# Altium footprint library PcbLib_ICs.PcbLib: 317 footprints (part 11 of 24) (continued)
## MSOP-8 [mm] "TSOP, 8-Leads, Body 3.00x3.00mm, Pitch 0.65mm, IPC Medium Density" (continued)
  text ".Designator" at -2.579,-0.349 h1.5
Top Text:
  lines w0.05: -3.2,-1.8 3.2,-1.8 3.2,1.8 -3.2,1.8 -3.2,-1.8
  lines w0.1: -0.5,0 0.5,0 ; 0,-0.5 0,0.5
3D body "SW3dPS-MSOP8.STEP": height 1.1, standoff 0, extent -2.519,-1.55 2.419,1.55

## MSOP-8EP [mm] "TSOP, 8-Leads, Body 3.00x3.00mm, Pitch 0.65mm, IPC Medium Density"
height 1.1
pads (9):
  rect 1.75x0.45 smd paste+0 mask+0.05: 1(-2.075,0.975)
  oval 1.75x0.45 smd paste+0 mask+0.05: 2(-2.075,0.325) 3(-2.075,-0.325) 4(-2.075,-0.975) 5(2.075,-0.975) 6(2.075,-0.325) 7(2.075,0.325) 8(2.075,0.975)
  rect 1.8x2.5 smd paste-10: EP(0,0)
via -0.4,0.8 diameter 0.7 hole 0.3
via 0.4,0.8 diameter 0.7 hole 0.3
via 0.4,0 diameter 0.7 hole 0.3
via -0.4,0 diameter 0.7 hole 0.3
via 0.4,-0.8 diameter 0.7 hole 0.3
via -0.4,-0.8 diameter 0.7 hole 0.3
Top Overlay:
  circle w0.25: c-2.75,1.75 r0.125
  lines w0.2: -1.75,-1.4 -1.75,-1.725 1.75,-1.725 1.75,-1.4 ; -1.75,1.4 -1.75,1.725 1.75,1.725 1.75,1.4
Top Paste:
  rectangle: -0.8,-1.15 -0.1,-0.45
  rectangle: 0.1,-1.15 0.8,-0.45
  rectangle: -0.8,-0.35 -0.1,0.35
  rectangle: 0.1,-0.35 0.8,0.35
  rectangle: 0.1,0.45 0.8,1.15
  rectangle: -0.8,0.45 -0.1,1.15
Bottom Solder:
  region: -1,1.5 1,1.5 1,0.3 0.7,0 1,-0.3 1,-1.5 -1,-1.5 -1,-0.3 -0.7,0 -1,0.3
Top Assy:
  circle w0.05: c-1,1 r0.2
  lines w0.05: -2.1,-1.125 -2.5,-1.125 -2.5,-0.825 -2.1,-0.825 ; -2.1,-1.125 -2.1,-0.825 ; -2.1,-1.125 -2,-1.125 ; -2.1,-0.825 -2,-0.825 ; -2.1,-0.475 -2.5,-0.475 -2.5,-0.175 -2.1,-0.175 ; -2.1,-0.475 -2.1,-0.175 ; -2.1,-0.475 -2,-0.475 ; -2.1,-0.175 -2,-0.175 ; -2.1,0.175 -2.5,0.175 -2.5,0.475 -2.1,0.475 ; -2.1,0.175 -2.1,0.475 ; -2.1,0.175 -2,0.175 ; -2.1,0.475 -2,0.475 ; -2.1,0.825 -2.5,0.825 -2.5,1.125 -2.1,1.125 ; -2.1,0.825 -2.1,1.125 ; -2.1,0.825 -2,0.825 ; -2.1,1.125 -2,1.125 ; -2,-1.125 -2,-0.825 ; -2,-1.125 -1.8,-1.125 ; -2,-0.825 -1.8,-0.825 ; -2,-0.475 -2,-0.175 ; -2,-0.475 -1.8,-0.475 ; -2,-0.175 -1.8,-0.175 ; -2,0.175 -2,0.475 ; -2,0.175 -1.8,0.175 ; -2,0.475 -1.8,0.475 ; -2,0.825 -2,1.125 ; -2,0.825 -1.8,0.825 ; -2,1.125 -1.8,1.125 ; -1.8,-1.125 -1.5,-1.125 ; -1.8,-1.125 -1.8,-0.825 ; -1.8,-0.825 -1.5,-0.825 ; -1.8,-0.475 -1.5,-0.475 ; -1.8,-0.475 -1.8,-0.175 ; -1.8,-0.175 -1.5,-0.175 ; -1.8,0.175 -1.5,0.175 ; -1.8,0.175 -1.8,0.475 ; -1.8,0.475 -1.5,0.475 ; -1.8,0.825 -1.5,0.825 ; -1.8,0.825 -1.8,1.125 ; -1.8,1.125 -1.5,1.125 ; -1.5,-1.5 -1.5,-1.125 ; -1.5,-1.5 -1.438,-1.438 ; -1.5,-1.5 1.5,-1.5 ; -1.5,-1.125 -1.5,-0.825 ; -1.5,-0.825 -1.5,-0.475 ; -1.5,-0.475 -1.5,-0.175 ; -1.5,-0.175 -1.5,0.175 ; -1.5,0.175 -1.5,0.475 ; -1.5,0.475 -1.5,0.825 ; -1.5,0.825 -1.5,1.125 ; -1.5,1.125 -1.5,1.5 ; -1.5,1.5 -1.438,1.438 ; -1.5,1.5 1.5,1.5 ; -1.438,-1.438 -1.438,1.438 ; -1.438,-1.438 1.438,-1.438 ; -1.438,1.438 1.438,1.438 ; 1.438,-1.438 1.5,-1.5 ; 1.438,-1.438 1.438,1.438 ; 1.438,1.438 1.5,1.5 ; 1.5,-1.5 1.5,-1.125 ; 1.5,-1.125 1.5,-0.825 ; 1.5,-1.125 1.8,-1.125 ; 1.5,-0.825 1.5,-0.475 ; 1.5,-0.825 1.8,-0.825 ; 1.5,-0.475 1.5,-0.175 ; 1.5,-0.475 1.8,-0.475 ; 1.5,-0.175 1.8,-0.175 ; 1.5,-0.175 1.5,0.175 ; 1.5,0.175 1.5,0.475 ; 1.5,0.175 1.8,0.175 ; 1.5,0.475 1.5,0.825 ; 1.5,0.475 1.8,0.475 ; 1.5,0.825 1.5,1.125 ; 1.5,0.825 1.8,0.825 ; 1.5,1.125 1.5,1.5 ; 1.5,1.125 1.8,1.125 ; 1.8,-1.125 2,-1.125 ; 1.8,-1.125 1.8,-0.825 ; 1.8,-0.825 2,-0.825 ; 1.8,-0.475 2,-0.475 ; 1.8,-0.475 1.8,-0.175 ; 1.8,-0.175 2,-0.175 ; 1.8,0.175 2,0.175 ; 1.8,0.175 1.8,0.475 ; 1.8,0.475 2,0.475 ; 1.8,0.825 2,0.825 ; 1.8,0.825 1.8,1.125 ; 1.8,1.125 2,1.125 ; 2,-1.125 2,-0.825 ; 2,-1.125 2.1,-1.125 ; 2,-0.825 2.1,-0.825 ; 2,-0.475 2,-0.175 ; 2,-0.475 2.1,-0.475 ; 2,-0.175 2.1,-0.175 ; 2,0.175 2,0.475 ; 2,0.175 2.1,0.175 ; 2,0.475 2.1,0.475 ; 2,0.825 2,1.125 ; 2,0.825 2.1,0.825 ; 2,1.125 2.1,1.125 ; 2.1,-1.125 2.5,-1.125 2.5,-0.825 2.1,-0.825 ; 2.1,-1.125 2.1,-0.825 ; 2.1,-0.475 2.5,-0.475 2.5,-0.175 2.1,-0.175 ; 2.1,-0.475 2.1,-0.175 ; 2.1,0.175 2.5,0.175 2.5,0.475 2.1,0.475 ; 2.1,0.175 2.1,0.475 ; 2.1,0.825 2.5,0.825 2.5,1.125 2.1,1.125 ; 2.1,0.825 2.1,1.125
  text ".Designator" at -2.579,-0.349 h1.5
Top Text:
  lines w0.05: -3.2,-1.8 3.2,-1.8 3.2,1.8 -3.2,1.8 -3.2,-1.8
  lines w0.1: -0.5,0 0.5,0 ; 0,-0.5 0,0.5
3D body "SW3dPS-MSOP8.STEP": height 1.1, standoff 0, extent -2.519,-1.55 2.419,1.55

## MSOP-10 [mm] "TSOP, 8-Leads, Body 3.00x3.00mm, Pitch 0.65mm, IPC Medium Density"
height 1.1
pads (10):
  rect 1.45x0.3 smd paste+0 mask+0.05: 1(-2.2,1)
  oval 1.45x0.3 smd paste+0 mask+0.05: 2(-2.2,0.5) 3(-2.2,0) 4(-2.2,-0.5) 5(-2.2,-1) 6(2.2,-1) 7(2.2,-0.5) 8(2.2,0) 9(2.2,0.5) 10(2.2,1)
Top Overlay:
  circle w0.25: c-2.75,1.75 r0.125
  lines w0.2: -1.75,-1.4 -1.75,-1.725 1.75,-1.725 1.75,-1.4 ; -1.75,1.4 -1.75,1.725 1.75,1.725 1.75,1.4
Top Assy:
  drawing of 195 lines, arcs and shapes, not listed
  text ".Designator" at -2.579,-0.349 h1.5
Top Text:
  lines w0.05: -3.2,-1.8 3.2,-1.8 3.2,1.8 -3.2,1.8 -3.2,-1.8
  lines w0.1: -0.5,0 0.5,0 ; 0,-0.5 0,0.5
3D body "User Library-msop-10.step": height 1.15, standoff 0, extent -2.45,-1.5 2.45,1.5

## MSOP-12EP [mm] "MSOP, 12-Leads, Body 3.00x4.00mm, Pitch 0.65mm"
height 1.1
pads (13):
  rect 1.1x0.42 smd paste+0 mask+0.05: 1(-2.15,1.625)
  oval 1.1x0.42 smd paste+0 mask+0.05: 2(-2.15,0.975) 3(-2.15,0.325) 4(-2.15,-0.325) 5(-2.15,-0.975) 6(-2.15,-1.625) 7(2.15,-1.625) 8(2.15,-0.975) 9(2.15,-0.325) 10(2.15,0.325) 11(2.15,0.975) 12(2.15,1.625)
  rrect10% 1.65x2.9 smd paste+0 mask+0.05: EP(0,0)
via -0.4,0.8 diameter 0.7 hole 0.3
via 0.4,0.8 diameter 0.7 hole 0.3
via 0.4,0 diameter 0.7 hole 0.3
via -0.4,0 diameter 0.7 hole 0.3
via 0.4,-0.8 diameter 0.7 hole 0.3
via -0.4,-0.8 diameter 0.7 hole 0.3
Top Overlay:
  circle w0.25: c-2.65,2.375 r0.125
  lines w0.2: -1.75,-2.1 -1.75,-2.35 1.75,-2.35 1.75,-2.1 ; -1.75,2.1 -1.75,2.35 1.75,2.35 1.75,2.1
Bottom Solder:
  region: -1.2,1.5 -0.3,1.5 0,1.2 0.3,1.5 1.2,1.5 1.2,0.3 0.9,0 1.2,-0.3 1.2,-1.5 0.3,-1.5 0,-1.2 -0.3,-1.5 -1.2,-1.5 -1.2,-0.3 -0.9,0 -1.2,0.3
Top Assy:
  drawing of 249 lines, arcs and shapes, not listed
  text ".Designator" at 0.35,-2.579 h1.5
Top Text:
  lines w0.05: -2.8,-2.5 -2.8,2.5 2.8,2.5 2.8,-2.5 -2.8,-2.5
  lines w0.1: -0.5,0 0.5,0 ; 0,-0.5 0,0.5
3D body "MSOP12-EP.step": height 0.98, standoff 0, extent -2.45,-2.02 2.45,2.019

## MSOP-16 [mm] "MSOP, 16-Leads, Body 4,04x3,00mm, Pitch 0,50mm, IPC Medium Density"
height 1.1
pads (16):
  rect 1.35x0.3 smd mask+0.05: 1(-2.225,1.75)
  oval 1.35x0.3 smd mask+0.05: 2(-2.225,1.25) 3(-2.225,0.75) 4(-2.225,0.25) 5(-2.225,-0.25) 6(-2.225,-0.75) 7(-2.225,-1.25) 8(-2.225,-1.75) 9(2.225,-1.75) 10(2.225,-1.25) 11(2.225,-0.75) 12(2.225,-0.25) 13(2.225,0.25) 14(2.225,0.75) 15(2.225,1.25) 16(2.225,1.75)
Top Overlay:
  circle w0.25: c-2.5,2.5 r0.125
  lines w0.2: -1.775,-2.15 -1.775,-2.475 1.725,-2.475 1.725,-2.15 ; -1.725,2.15 -1.725,2.475 1.775,2.475 1.775,2.15
Top Assy:
  drawing of 270 lines, arcs and shapes, not listed
  text ".Designator" at 0.349,-2.579 h1.5
Top Text:
  lines w0.05: -3.15,-2.35 3.15,-2.35 3.15,2.35 -3.15,2.35 -3.15,-2.35
  lines w0.1: -0.5,0 0.5,0 ; 0,-0.5 0,0.5
3D body "MSOP-16.step": height 1.1, standoff 0, extent -2.45,-2.05 2.45,2.05

## MSOP-16EP [mm] "MSOP, 16-Leads, Body 4,04x3,00mm, Pitch 0,50mm, IPC Medium Density"
height 1.1
pads (17):
  rect 1.35x0.3 smd mask+0.05: 1(-2.225,1.75)
  oval 1.35x0.3 smd mask+0.05: 2(-2.225,1.25) 3(-2.225,0.75) 4(-2.225,0.25) 5(-2.225,-0.25) 6(-2.225,-0.75) 7(-2.225,-1.25) 8(-2.225,-1.75) 9(2.225,-1.75) 10(2.225,-1.25) 11(2.225,-0.75) 12(2.225,-0.25) 13(2.225,0.25) 14(2.225,0.75) 15(2.225,1.25) 16(2.225,1.75)
  rrect8% 1.65x2.85 smd paste-10 mask+0.05: EP(0,0)
via -0.4,-0.8 diameter 0.7 hole 0.3
via 0.4,-0.8 diameter 0.7 hole 0.3
via -0.4,0 diameter 0.7 hole 0.3
via 0.4,0 diameter 0.7 hole 0.3
via 0.4,0.8 diameter 0.7 hole 0.3
via -0.4,0.8 diameter 0.7 hole 0.3
Top Overlay:
  circle w0.25: c-2.5,2.5 r0.125
  lines w0.2: -1.725,-2.15 -1.725,-2.25 1.775,-2.25 1.775,-2.15 ; -1.725,2.15 -1.725,2.25 1.775,2.25 1.775,2.15
Top Paste:
  rectangle: -0.8,0.55 -0.1,1.25
  rectangle: 0.1,0.55 0.8,1.25
  rectangle: 0.1,-0.35 0.8,0.35
  rectangle: -0.8,-0.35 -0.1,0.35
  rectangle: 0.1,-1.25 0.8,-0.55
  rectangle: -0.8,-1.25 -0.1,-0.55
Bottom Solder:
  region: -1.2,1.5 -0.3,1.5 0,1.2 0.3,1.5 1.2,1.5 1.2,0.3 0.9,0 1.2,-0.3 1.2,-1.5 0.3,-1.5 0,-1.2 -0.3,-1.5 -1.2,-1.5 -1.2,-0.3 -0.9,0 -1.2,0.3
Top Assy:
  drawing of 270 lines, arcs and shapes, not listed
  text ".Designator" at 0.349,-2.579 h1.5
Top Text:
  lines w0.05: -3.15,-2.35 3.15,-2.35 3.15,2.35 -3.15,2.35 -3.15,-2.35
  lines w0.1: -0.5,0 0.5,0 -0.5,0 ; 0,-0.5 0,0.5 0,-0.5
3D body "MSOP-16EP.STEP": height 0.86, standoff 0, extent -2.45,-2.019 2.45,2.02

## PBGA-491 [mm] "BGA, 491-Leads, Body 17.00x17.00mmx0.90mm, Pitch 0.65mm"
height 0.9
pads (491):
  round 0.36 smd paste+0 mask+0.05: A1(-7.8,-7.8) A2(-7.8,-7.15) A3(-7.8,-6.5) A4(-7.8,-5.85) A5(-7.8,-5.2) A6(-7.8,-4.55) A7(-7.8,-3.9) A8(-7.8,-3.25) A9(-7.8,-2.6) A10(-7.8,-1.95) A11(-7.8,-1.3) A12(-7.8,-0.65) A13(-7.8,0) A14(-7.8,0.65) A15(-7.8,1.3) A16(-7.8,1.95) A17(-7.8,2.6) A18(-7.8,3.25) A19(-7.8,3.9) A20(-7.8,4.55) A21(-7.8,5.2) A22(-7.8,5.85) A23(-7.8,6.5) A24(-7.8,7.15) A25(-7.8,7.8) AA1(5.2,-7.8) AA2(5.2,-7.15) AA3(5.2,-6.5) AA7(5.2,-3.9) AA9(5.2,-2.6) AA10(5.2,-1.95) AA12(5.2,-0.65) AA13(5.2,0) AA15(5.2,1.3) AA16(5.2,1.95) AA18(5.2,3.25) AA19(5.2,3.9) AA23(5.2,6.5) AA24(5.2,7.15) AA25(5.2,7.8) AB1(5.85,-7.8) AB2(5.85,-7.15) AB6(5.85,-4.55) AB7(5.85,-3.9) AB9(5.85,-2.6) AB10(5.85,-1.95) AB12(5.85,-0.65) AB13(5.85,0) AB15(5.85,1.3) AB16(5.85,1.95) AB18(5.85,3.25) AB19(5.85,3.9) AB20(5.85,4.55) AB24(5.85,7.15) AB25(5.85,7.8) AC1(6.5,-7.8) AC2(6.5,-7.15) AC3(6.5,-6.5) AC5(6.5,-5.2) AC6(6.5,-4.55) AC7(6.5,-3.9) AC9(6.5,-2.6) AC10(6.5,-1.95) AC12(6.5,-0.65) AC13(6.5,0) AC15(6.5,1.3) AC16(6.5,1.95) AC18(6.5,3.25) AC20(6.5,4.55) AC21(6.5,5.2) AC23(6.5,6.5) AC24(6.5,7.15) AC25(6.5,7.8) AD1(7.15,-7.8) AD2(7.15,-7.15) AD3(7.15,-6.5) AD4(7.15,-5.85) AD5(7.15,-5.2) AD6(7.15,-4.55) AD7(7.15,-3.9) AD8(7.15,-3.25) AD9(7.15,-2.6) AD10(7.15,-1.95) AD11(7.15,-1.3) AD12(7.15,-0.65) AD13(7.15,0) AD14(7.15,0.65) AD15(7.15,1.3) AD16(7.15,1.95) AD17(7.15,2.6) AD18(7.15,3.25) AD19(7.15,3.9) AD20(7.15,4.55) AD21(7.15,5.2) AD22(7.15,5.85) AD23(7.15,6.5) AD24(7.15,7.15) AD25(7.15,7.8) AE1(7.8,-7.8) AE2(7.8,-7.15) AE3(7.8,-6.5) AE4(7.8,-5.85) AE5(7.8,-5.2) AE6(7.8,-4.55) AE7(7.8,-3.9) AE8(7.8,-3.25) AE9(7.8,-2.6) AE10(7.8,-1.95) AE11(7.8,-1.3) AE12(7.8,-0.65) AE13(7.8,0) AE14(7.8,0.65) AE15(7.8,1.3) AE16(7.8,1.95) AE17(7.8,2.6) AE18(7.8,3.25) AE19(7.8,3.9) AE20(7.8,4.55) AE21(7.8,5.2) AE22(7.8,5.85) AE23(7.8,6.5) AE24(7.8,7.15) AE25(7.8,7.8) B1(-7.15,-7.8) B2(-7.15,-7.15) B3(-7.15,-6.5) B4(-7.15,-5.85) B5(-7.15,-5.2) B6(-7.15,-4.55) B7(-7.15,-3.9) B8(-7.15,-3.25) B9(-7.15,-2.6) B10(-7.15,-1.95) B11(-7.15,-1.3) B12(-7.15,-0.65) B13(-7.15,0) B14(-7.15,0.65) B15(-7.15,1.3) B16(-7.15,1.95) B17(-7.15,2.6) B18(-7.15,3.25) B19(-7.15,3.9) B20(-7.15,4.55) B21(-7.15,5.2) B22(-7.15,5.85) B23(-7.15,6.5) B24(-7.15,7.15) B25(-7.15,7.8) C1(-6.5,-7.8) C2(-6.5,-7.15) C3(-6.5,-6.5) C5(-6.5,-5.2) C6(-6.5,-4.55) C8(-6.5,-3.25) C10(-6.5,-1.95) C11(-6.5,-1.3) C13(-6.5,0) C14(-6.5,0.65) C16(-6.5,1.95) C17(-6.5,2.6) C19(-6.5,3.9) C20(-6.5,4.55) C21(-6.5,5.2) C23(-6.5,6.5) C24(-6.5,7.15) C25(-6.5,7.8) D1(-5.85,-7.8) D2(-5.85,-7.15) D6(-5.85,-4.55) D7(-5.85,-3.9) D8(-5.85,-3.25) D10(-5.85,-1.95) D11(-5.85,-1.3) D13(-5.85,0) D14(-5.85,0.65) D16(-5.85,1.95) D17(-5.85,2.6) D19(-5.85,3.9) D20(-5.85,4.55) D24(-5.85,7.15) D25(-5.85,7.8) E1(-5.2,-7.8) E2(-5.2,-7.15) E3(-5.2,-6.5) E7(-5.2,-3.9) E8(-5.2,-3.25) E10(-5.2,-1.95) E11(-5.2,-1.3) E13(-5.2,0) E14(-5.2,0.65) E16(-5.2,1.95) E17(-5.2,2.6) E19(-5.2,3.9) E23(-5.2,6.5) E24(-5.2,7.15) E25(-5.2,7.8) F1(-4.55,-7.8) F2(-4.55,-7.15) F3(-4.55,-6.5) F4(-4.55,-5.85) F6(-4.55,-4.55) F7(-4.55,-3.9) F8(-4.55,-3.25) F10(-4.55,-1.95) F11(-4.55,-1.3) F13(-4.55,0) F14(-4.55,0.65) F16(-4.55,1.95) F17(-4.55,2.6) F19(-4.55,3.9) F20(-4.55,4.55) F22(-4.55,5.85) F23(-4.55,6.5) F24(-4.55,7.15) F25(-4.55,7.8) G1(-3.9,-7.8) G2(-3.9,-7.15) G3(-3.9,-6.5) G4(-3.9,-5.85) G5(-3.9,-5.2) G6(-3.9,-4.55) G8(-3.9,-3.25) G10(-3.9,-1.95) G11(-3.9,-1.3) G13(-3.9,0) G14(-3.9,0.65) G16(-3.9,1.95) G17(-3.9,2.6) G20(-3.9,4.55) G21(-3.9,5.2) G22(-3.9,5.85) G24(-3.9,7.15) G25(-3.9,7.8) H1(-3.25,-7.8) H2(-3.25,-7.15) H8(-3.25,-3.25) H9(-3.25,-2.6) H10(-3.25,-1.95) H11(-3.25,-1.3) H12(-3.25,-0.65) H13(-3.25,0) H14(-3.25,0.65) H15(-3.25,1.3) H16(-3.25,1.95) H17(-3.25,2.6) H18(-3.25,3.25) H19(-3.25,3.9) H20(-3.25,4.55) H21(-3.25,5.2) H22(-3.25,5.85) H23(-3.25,6.5) H24(-3.25,7.15) H25(-3.25,7.8) J1(-2.6,-7.8) J2(-2.6,-7.15) J3(-2.6,-6.5) J4(-2.6,-5.85) J5(-2.6,-5.2) J6(-2.6,-4.55) J7(-2.6,-3.9) J8(-2.6,-3.25) J9(-2.6,-2.6) J10(-2.6,-1.95) J11(-2.6,-1.3) J12(-2.6,-0.65) J13(-2.6,0) J14(-2.6,0.65) J15(-2.6,1.3) J16(-2.6,1.95) J17(-2.6,2.6) J18(-2.6,3.25) J24(-2.6,7.15) J25(-2.6,7.8) K1(-1.95,-7.8) K2(-1.95,-7.15) K3(-1.95,-6.5) K4(-1.95,-5.85) K5(-1.95,-5.2) K6(-1.95,-4.55) K7(-1.95,-3.9) K8(-1.95,-3.25) K9(-1.95,-2.6) K11(-1.95,-1.3) K12(-1.95,-0.65) K14(-1.95,0.65) K15(-1.95,1.3) K17(-1.95,2.6) K18(-1.95,3.25) K19(-1.95,3.9) K20(-1.95,4.55) K21(-1.95,5.2) K22(-1.95,5.85) K23(-1.95,6.5) K24(-1.95,7.15) K25(-1.95,7.8) L1(-1.3,-7.8) L2(-1.3,-7.15) L8(-1.3,-3.25) L9(-1.3,-2.6) L11(-1.3,-1.3) L12(-1.3,-0.65) L14(-1.3,0.65) L15(-1.3,1.3) L17(-1.3,2.6) L18(-1.3,3.25) L19(-1.3,3.9) L20(-1.3,4.55) L21(-1.3,5.2) L22(-1.3,5.85) L23(-1.3,6.5) L24(-1.3,7.15) L25(-1.3,7.8) M1(-0.65,-7.8) M2(-0.65,-7.15) M3(-0.65,-6.5) M4(-0.65,-5.85) M5(-0.65,-5.2) M6(-0.65,-4.55) M7(-0.65,-3.9) M8(-0.65,-3.25) M9(-0.65,-2.6) M10(-0.65,-1.95) M11(-0.65,-1.3) M12(-0.65,-0.65) M13(-0.65,0) M14(-0.65,0.65) M15(-0.65,1.3) M16(-0.65,1.95) M17(-0.65,2.6) M18(-0.65,3.25) M24(-0.65,7.15) M25(-0.65,7.8) N1(0,-7.8) N2(0,-7.15) N3(0,-6.5) N4(0,-5.85) N5(0,-5.2) N6(0,-4.55) N7(0,-3.9) N8(0,-3.25) N9(0,-2.6) N10(0,-1.95) N11(0,-1.3) N12(0,-0.65) N13(0,0) N14(0,0.65) N15(0,1.3) N16(0,1.95) N17(0,2.6) N18(0,3.25) N19(0,3.9) N20(0,4.55) N21(0,5.2) N22(0,5.85) N23(0,6.5) N24(0,7.15) N25(0,7.8) P1(0.65,-7.8) P2(0.65,-7.15) P8(0.65,-3.25) P9(0.65,-2.6) P10(0.65,-1.95) P11(0.65,-1.3) P12(0.65,-0.65) P13(0.65,0) P14(0.65,0.65) P15(0.65,1.3) P16(0.65,1.95) P17(0.65,2.6) P18(0.65,3.25) P19(0.65,3.9) P20(0.65,4.55) P21(0.65,5.2) P22(0.65,5.85) P23(0.65,6.5) P24(0.65,7.15) P25(0.65,7.8) R1(1.3,-7.8) R2(1.3,-7.15) R3(1.3,-6.5) R4(1.3,-5.85) R5(1.3,-5.2) R6(1.3,-4.55) R7(1.3,-3.9) R8(1.3,-3.25) R9(1.3,-2.6) R11(1.3,-1.3) R12(1.3,-0.65) R14(1.3,0.65) R15(1.3,1.3) R17(1.3,2.6) R18(1.3,3.25) R24(1.3,7.15) R25(1.3,7.8) T1(1.95,-7.8) T2(1.95,-7.15) T3(1.95,-6.5) T4(1.95,-5.85) T5(1.95,-5.2) T6(1.95,-4.55) T7(1.95,-3.9) T8(1.95,-3.25) T9(1.95,-2.6) T11(1.95,-1.3) T12(1.95,-0.65) T14(1.95,0.65) T15(1.95,1.3) T17(1.95,2.6) T18(1.95,3.25) T19(1.95,3.9) T20(1.95,4.55) T21(1.95,5.2) T22(1.95,5.85) T23(1.95,6.5) T24(1.95,7.15) T25(1.95,7.8) U1(2.6,-7.8) U2(2.6,-7.15) U8(2.6,-3.25) U9(2.6,-2.6) U10(2.6,-1.95) U11(2.6,-1.3) U12(2.6,-0.65) U13(2.6,0) U14(2.6,0.65) U15(2.6,1.3) U16(2.6,1.95) U17(2.6,2.6) U18(2.6,3.25) U19(2.6,3.9) U20(2.6,4.55) U21(2.6,5.2) U22(2.6,5.85) U23(2.6,6.5) U24(2.6,7.15) U25(2.6,7.8) V1(3.25,-7.8) V2(3.25,-7.15) V3(3.25,-6.5) V4(3.25,-5.85) V5(3.25,-5.2) V6(3.25,-4.55) V7(3.25,-3.9) V8(3.25,-3.25) V9(3.25,-2.6) V10(3.25,-1.95) V11(3.25,-1.3) V12(3.25,-0.65) V13(3.25,0) V14(3.25,0.65) V15(3.25,1.3) V16(3.25,1.95) V17(3.25,2.6) V18(3.25,3.25) V24(3.25,7.15) V25(3.25,7.8) W1(3.9,-7.8) W2(3.9,-7.15) W4(3.9,-5.85) W5(3.9,-5.2) W6(3.9,-4.55) W10(3.9,-1.95) W12(3.9,-0.65) W13(3.9,0) W15(3.9,1.3) W16(3.9,1.95) W18(3.9,3.25) W20(3.9,4.55) W21(3.9,5.2) W22(3.9,5.85) W23(3.9,6.5) W24(3.9,7.15) W25(3.9,7.8) Y1(4.55,-7.8) Y2(4.55,-7.15) Y3(4.55,-6.5) Y4(4.55,-5.85) Y6(4.55,-4.55) Y7(4.55,-3.9) Y10(4.55,-1.95) Y12(4.55,-0.65) Y13(4.55,0) Y15(4.55,1.3) Y16(4.55,1.95) Y18(4.55,3.25) Y19(4.55,3.9) Y20(4.55,4.55) Y22(4.55,5.85) Y23(4.55,6.5) Y24(4.55,7.15) Y25(4.55,7.8)
Top Overlay:
  circle w0.25: c-8.35,-9.15 r0.125
  region: -8.5,-7.92 -7.92,-8.5 -8.5,-8.5
  lines w0.2: -8.5,-7.92 -7.92,-8.5 ; -8.5,-8.5 -8.5,8.5 8.5,8.5 8.5,-8.5 -8.5,-8.5
Top Simple Assy:
  circle w0.05: c-7.475,-7.475 r0.65
  lines w0.05: -8.5,-8.5 8.5,-8.5 8.5,8.5 -8.5,8.5 -8.5,-8.5 ; -8.5,-8.5 8.502,-8.5 8.502,8.502 -8.5,8.502 -8.5,-8.5
Top Assy:
  circle w0.05: c-7.475,-7.475 r0.65
  lines w0.05: -8.5,-8.5 8.502,-8.5 8.502,8.502 -8.5,8.502 -8.5,-8.5 ; -8.5,-8.5 -8.5,8.5 8.5,8.5 8.5,-8.5 -8.5,-8.5
  text ".Designator" at -3.443,-0.467 h2
Top Text:
  lines w0.1: -0.5,0 0.5,0 ; 0,-0.5 0,0.5
3D body "PBGA-491.STEP": height 1.15, standoff -0.03, extent -8.5,-8.5 8.502,8.502

## PDIP8_GW [mm]
pads (8):
  rect 1.78x1.52 smd paste+0 mask+0.05: 1(-4.505,3.81)
  oct 1.78x1.52 smd paste+0 mask+0.05: 2(-4.505,1.27) 3(-4.505,-1.27) 4(-4.505,-3.81) 5(4.505,-3.81) 6(4.505,-1.27) 7(4.505,1.27) 8(4.505,3.81)
Top Overlay:
  circle w0.6: c-2.1,3.6 r0.25
  circle w0.6: c-4.4,5.6 r0.25
  lines w0.2: -3.1,-4.6 -3.1,4.6 3.1,4.6 3.1,-4.6 -3.1,-4.6
Top Assy:
  drawing of 197 lines, arcs and shapes, not listed
  text ".Designator" at -3.443,-0.467 h2
Top Text:
  lines w0.1: -0.5,0 0.5,0 ; 0,-0.5 0,0.5
3D body "PDIP8_GW.STEP": height 4.32, standoff 0, extent -5.15,-4.828 5.15,4.828

## PDIP8_GW_DIP8 [mm]
pads (16):
  rect 1.78x1.52 smd paste+0 mask+0.05: 1(-4.805,3.81)
  rect 2.5x1.52 hole 0.8 mask+0.075: 1(-3.81,3.81)
  oct 1.78x1.52 smd paste+0 mask+0.05: 2(-4.805,1.27) 3(-4.805,-1.27) 4(-4.805,-3.81) 5(4.805,-3.81) 6(4.805,-1.27) 7(4.805,1.27) 8(4.805,3.81)
  oval 2.5x1.52 hole 0.8 mask+0.075: 2(-3.81,1.27) 3(-3.81,-1.27) 4(-3.81,-3.81) 5(3.81,-3.81) 6(3.81,-1.27) 7(3.81,1.27) 8(3.81,3.81)
Top Overlay:
  circle w0.6: c-4.4,5.6 r0.25
  circle w0.6: c-1.4,3.8 r0.25
  lines w0.2: -2.2,-4.6 2.2,-4.6 2.2,4.6 -2.2,4.6 -2.2,-4.6
Top Assy:
  drawing of 197 lines, arcs and shapes, not listed
  text ".Designator" at -3.443,-0.467 h2
Top Text:
  lines w0.1: -0.5,0 0.5,0 ; 0,-0.5 0,0.5
3D body "PDIP8_GW.STEP": height 4.32, standoff 0, extent -5.15,-4.828 5.15,4.828

## PG256S [mm] "BGA, 256-Leads, Body 17,00x17,00mmx1,22mm, Pitch 1,00mm"
height 1.22
pads (256):
  round 0.5 smd mask+0.05: A1(-7.5,7.5) A2(-6.5,7.5) A3(-5.5,7.5) A4(-4.5,7.5) A5(-3.5,7.5) A6(-2.5,7.5) A7(-1.5,7.5) A8(-0.5,7.5) A9(0.5,7.5) A10(1.5,7.5) A11(2.5,7.5) A12(3.5,7.5) A13(4.5,7.5) A14(5.5,7.5) A15(6.5,7.5) A16(7.5,7.5) B1(-7.5,6.5) B2(-6.5,6.5) B3(-5.5,6.5) B4(-4.5,6.5) B5(-3.5,6.5) B6(-2.5,6.5) B7(-1.5,6.5) B8(-0.5,6.5) B9(0.5,6.5) B10(1.5,6.5) B11(2.5,6.5) B12(3.5,6.5) B13(4.5,6.5) B14(5.5,6.5) B15(6.5,6.5) B16(7.5,6.5) C1(-7.5,5.5) C2(-6.5,5.5) C3(-5.5,5.5) C4(-4.5,5.5) C5(-3.5,5.5) C6(-2.5,5.5) C7(-1.5,5.5) C8(-0.5,5.5) C9(0.5,5.5) C10(1.5,5.5) C11(2.5,5.5) C12(3.5,5.5) C13(4.5,5.5) C14(5.5,5.5) C15(6.5,5.5) C16(7.5,5.5) D1(-7.5,4.5) D2(-6.5,4.5) D3(-5.5,4.5) D4(-4.5,4.5) D5(-3.5,4.5) D6(-2.5,4.5) D7(-1.5,4.5) D8(-0.5,4.5) D9(0.5,4.5) D10(1.5,4.5) D11(2.5,4.5) D12(3.5,4.5) D13(4.5,4.5) D14(5.5,4.5) D15(6.5,4.5) D16(7.5,4.5) E1(-7.5,3.5) E2(-6.5,3.5) E3(-5.5,3.5) E4(-4.5,3.5) E5(-3.5,3.5) E6(-2.5,3.5) E7(-1.5,3.5) E8(-0.5,3.5) E9(0.5,3.5) E10(1.5,3.5) E11(2.5,3.5) E12(3.5,3.5) E13(4.5,3.5) E14(5.5,3.5) E15(6.5,3.5) E16(7.5,3.5) F1(-7.5,2.5) F2(-6.5,2.5) F3(-5.5,2.5) F4(-4.5,2.5) F5(-3.5,2.5) F6(-2.5,2.5) F7(-1.5,2.5) F8(-0.5,2.5) F9(0.5,2.5) F10(1.5,2.5) F11(2.5,2.5) F12(3.5,2.5) F13(4.5,2.5) F14(5.5,2.5) F15(6.5,2.5) F16(7.5,2.5) G1(-7.5,1.5) G2(-6.5,1.5) G3(-5.5,1.5) G4(-4.5,1.5) G5(-3.5,1.5) G6(-2.5,1.5) G7(-1.5,1.5) G8(-0.5,1.5) G9(0.5,1.5) G10(1.5,1.5) G11(2.5,1.5) G12(3.5,1.5) G13(4.5,1.5) G14(5.5,1.5) G15(6.5,1.5) G16(7.5,1.5) H1(-7.5,0.5) H2(-6.5,0.5) H3(-5.5,0.5) H4(-4.5,0.5) H5(-3.5,0.5) H6(-2.5,0.5) H7(-1.5,0.5) H8(-0.5,0.5) H9(0.5,0.5) H10(1.5,0.5) H11(2.5,0.5) H12(3.5,0.5) H13(4.5,0.5) H14(5.5,0.5) H15(6.5,0.5) H16(7.5,0.5) J1(-7.5,-0.5) J2(-6.5,-0.5) J3(-5.5,-0.5) J4(-4.5,-0.5) J5(-3.5,-0.5) J6(-2.5,-0.5) J7(-1.5,-0.5) J8(-0.5,-0.5) J9(0.5,-0.5) J10(1.5,-0.5) J11(2.5,-0.5) J12(3.5,-0.5) J13(4.5,-0.5) J14(5.5,-0.5) J15(6.5,-0.5) J16(7.5,-0.5) K1(-7.5,-1.5) K2(-6.5,-1.5) K3(-5.5,-1.5) K4(-4.5,-1.5) K5(-3.5,-1.5) K6(-2.5,-1.5) K7(-1.5,-1.5) K8(-0.5,-1.5) K9(0.5,-1.5) K10(1.5,-1.5) K11(2.5,-1.5) K12(3.5,-1.5) K13(4.5,-1.5) K14(5.5,-1.5) K15(6.5,-1.5) K16(7.5,-1.5) L1(-7.5,-2.5) L2(-6.5,-2.5) L3(-5.5,-2.5) L4(-4.5,-2.5) L5(-3.5,-2.5) L6(-2.5,-2.5) L7(-1.5,-2.5) L8(-0.5,-2.5) L9(0.5,-2.5) L10(1.5,-2.5) L11(2.5,-2.5) L12(3.5,-2.5) L13(4.5,-2.5) L14(5.5,-2.5) L15(6.5,-2.5) L16(7.5,-2.5) M1(-7.5,-3.5) M2(-6.5,-3.5) M3(-5.5,-3.5) M4(-4.5,-3.5) M5(-3.5,-3.5) M6(-2.5,-3.5) M7(-1.5,-3.5) M8(-0.5,-3.5) M9(0.5,-3.5) M10(1.5,-3.5) M11(2.5,-3.5) M12(3.5,-3.5) M13(4.5,-3.5) M14(5.5,-3.5) M15(6.5,-3.5) M16(7.5,-3.5) N1(-7.5,-4.5) N2(-6.5,-4.5) N3(-5.5,-4.5) N4(-4.5,-4.5) N5(-3.5,-4.5) N6(-2.5,-4.5) N7(-1.5,-4.5) N8(-0.5,-4.5) N9(0.5,-4.5) N10(1.5,-4.5) N11(2.5,-4.5) N12(3.5,-4.5) N13(4.5,-4.5) N14(5.5,-4.5) N15(6.5,-4.5) N16(7.5,-4.5) P1(-7.5,-5.5) P2(-6.5,-5.5) P3(-5.5,-5.5) P4(-4.5,-5.5) P5(-3.5,-5.5) P6(-2.5,-5.5) P7(-1.5,-5.5) P8(-0.5,-5.5) P9(0.5,-5.5) P10(1.5,-5.5) P11(2.5,-5.5) P12(3.5,-5.5) P13(4.5,-5.5) P14(5.5,-5.5) P15(6.5,-5.5) P16(7.5,-5.5) R1(-7.5,-6.5) R2(-6.5,-6.5) R3(-5.5,-6.5) R4(-4.5,-6.5) R5(-3.5,-6.5) R6(-2.5,-6.5) R7(-1.5,-6.5) R8(-0.5,-6.5) R9(0.5,-6.5) R10(1.5,-6.5) R11(2.5,-6.5) R12(3.5,-6.5) R13(4.5,-6.5) R14(5.5,-6.5) R15(6.5,-6.5) R16(7.5,-6.5) T1(-7.5,-7.5) T2(-6.5,-7.5) T3(-5.5,-7.5) T4(-4.5,-7.5) T5(-3.5,-7.5) T6(-2.5,-7.5) T7(-1.5,-7.5) T8(-0.5,-7.5) T9(0.5,-7.5) T10(1.5,-7.5) T11(2.5,-7.5) T12(3.5,-7.5) T13(4.5,-7.5) T14(5.5,-7.5) T15(6.5,-7.5) T16(7.5,-7.5)
Top Overlay:
  circle w0.25: c-9.15,8.35 r0.125
  region: -7.5,8.5 -8.5,7.5 -8.5,8.5
  lines w0.2: -8.5,7.5 -7.5,8.5 ; -8.5,-8.5 -8.5,8.5 8.5,8.5 8.5,-8.5 -8.5,-8.5
Top Assy:
  circle w0.05: c-7.5,7.5 r0.3
  lines w0.05: -8.5,-8.5 -8.5,8.5 8.5,8.5 8.5,-8.5 -8.5,-8.5
  text ".Designator" at -3.443,-0.467 h2
Top Text:
  lines w0.05: -8.75,-8.75 -8.75,8.75 8.75,8.75 8.75,-8.75 -8.75,-8.75
  lines w0.1: -0.5,0 0.5,0 ; 0,-0.5 0,0.5
3D body "GOWIN_PG256S.STEP": height 1.2, standoff -0.04, extent -8.5,-8.5 8.5,8.5

## PowerFLAT-8L [mm] "8-Leads, Body 3.30x3.30mm, Pitch 0.65mm"
height 1.05
pads (8):
  rect 1.2x0.48 smd paste-50 mask+0.04: 1(1.4,-0.97) 2(1.4,-0.32) 3(1.4,0.33) 4(1.4,0.98)
  rect 1.2x0.48 smd mask+0.04: 5(-1.4,0.98) 6(-1.4,0.33) 7(-1.4,-0.32) 8(-1.4,-0.97)
Top Layer:
  region: 0.8,0.57 1.55,0.57 1.55,-1.21 0.8,-1.21
  region: -1.4,1.22 -1.1,1.22 -1.1,1.78 0.1,1.78 0.1,1.33 0.3,1.33 0.3,-1.32 0.1,-1.32 0.1,-1.77 -1.1,-1.77 -1.1,-1.21 -1.44,-1.21 -1.43,-1.2 -1.43,-0.73 -1.3,-0.73 -1.3,0.74 -1.4,0.74
Top Overlay:
  circle w0.25: c1.4,-2.01 r0.125
  lines w0.1: -1.65,-1.37 -1.65,-1.65 -1.37,-1.65 ; -1.65,1.38 -1.65,1.66 -1.37,1.66 ; 1.37,-1.65 1.65,-1.65 1.65,-1.37 ; 1.37,1.66 1.65,1.66 1.65,1.38
Top Paste:
  region: 2,-0.72 1.5,-0.72 1.5,-1.22 2,-1.22
  rectangle: 0.8,-1.22 1.3,-0.72
  region: 2,-0.07 1.5,-0.07 1.5,-0.57 2,-0.57
  rectangle: 0.8,-0.57 1.3,-0.07
  region: 2,0.58 1.5,0.58 1.5,0.08 2,0.08
  rectangle: 0.8,0.08 1.3,0.58
  region: 2,1.23 1.5,1.23 1.5,0.73 2,0.73
  rectangle: 0.8,0.73 1.3,1.23
  rectangle: 0.8,-0.68 1.55,-0.59
  rectangle: 0.8,-0.05 1.55,0.06
  rectangle: -0.19,-1.32 0.3,-0.62
  rectangle: -0.74,-1.21 -0.29,-0.62
  rectangle: -0.74,-1.77 -0.29,-1.27
  rectangle: -0.19,-1.77 0.1,-1.21
  rectangle: -1.1,-1.77 -0.8,-1.27
  rectangle: -1.1,1.28 -0.89,1.78
  rectangle: -0.74,-0.52 -0.29,-0.02
  rectangle: -0.74,0.08 -0.29,0.58
  rectangle: -0.74,0.68 -0.29,1.18
  rectangle: -0.79,1.28 -0.29,1.78
  rectangle: -0.19,-0.52 0.31,-0.02
  rectangle: -0.19,0.08 0.31,0.58
  rectangle: -0.19,0.68 0.3,1.33
  rectangle: -0.19,1.28 0.1,1.78
Top Solder:
  region: 0.8,0.57 1.55,0.57 1.55,-1.21 0.8,-1.21
  region: -1.4,1.22 -1.1,1.22 -1.1,1.78 0.1,1.78 0.1,1.33 0.3,1.33 0.3,-1.32 0.1,-1.32 0.1,-1.72 -1.1,-1.72 -1.1,-1.21 -1.44,-1.21 -1.43,-1.2 -1.43,-0.73 -1.3,-0.73 -1.3,0.74 -1.4,0.74
Top Assy:
  circle w0.05: c1.2,-1.2 r0.2
  lines w0.05: -1.651,-1.138 -1.73,-1.138 -1.73,-0.813 -1.65,-0.813 ; -1.651,-0.487 -1.73,-0.487 -1.73,-0.163 -1.65,-0.163 ; -1.651,0.162 -1.73,0.162 -1.73,0.487 -1.65,0.487 ; -1.651,0.813 -1.73,0.813 -1.73,1.137 -1.65,1.137 ; -0.9,-1.65 -0.9,-1.73 -0.1,-1.73 -0.1,-1.65 ; -0.9,1.65 -0.9,1.73 -0.1,1.73 -0.1,1.65 ; 1.65,-0.813 1.73,-0.813 1.73,-1.138 1.651,-1.138 ; 1.65,-0.163 1.73,-0.163 1.73,-0.487 1.651,-0.487 ; 1.65,0.487 1.73,0.487 1.73,0.162 1.651,0.162 ; 1.65,1.137 1.73,1.137 1.73,0.813 1.651,0.813 ; -1.65,-1.65 1.65,-1.65 1.65,1.65 -1.65,1.65 -1.65,-1.65
  text ".Designator" at -2.579,-0.349 h1.5
Top Text:
  lines w0.1: -0.5,0 0.5,0 ; 0,-0.5 0,0.5
3D body "User Library-MLP-3_3x3_3-1.STEP": height 0.8, standoff 0, extent -1.65,-1.65 1.65,1.65